# Altium schematic symbol library jlcpcb_2025_04_resistors_extended_2512.schlib: 2667 symbols (part 13 of 14)
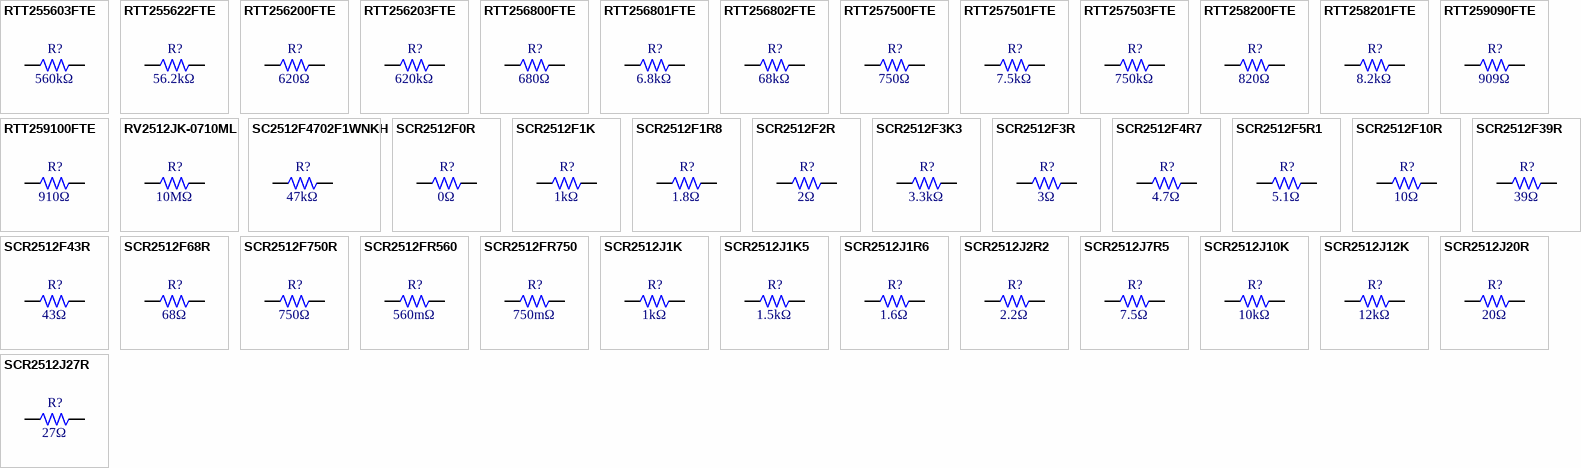
[diagram p78: symbols RTT255603FTE to SCR2512J27R]

## RTT256801FTE
designator R?  Resistance: 6.8kΩ  (hidden comment: *)
Resistor, 6.8kΩ, ±1%, 1W, 200V, ±100ppm/℃, -55℃~+155℃, SMD 2512; Manufacturer: Uniroyal; Manufacturer Part Number: RTT256801FTE; Supplier 1: LCSC; Supplier Part Number 1: C333662; JLCPCB Part Number: C333662; Power Rating: 1W; Category: Resistors; Package Size: 2512; JLCPCB Basic Part: Yes; Tolerance: ±1%; Voltage Rating: 200V; Temperature Coefficient: ±100ppm/℃; Temperature Rating: -55℃~+155℃; ComponentLink1Description: Datasheet; ComponentLink1URL: https://wmsc.lcsc.com/wmsc/upload/file/pdf/v2/lcsc/2304140030_RALEC-RTT256801FTE_C333662.pdf; ComponentLink2Description: JLCPCB Part URL; ComponentLink2URL: https://jlcpcb.com/partdetail/C333662
pins: 1, 2
1 alternate drawing of the same symbol

## RTT256802FTE
designator R?  Resistance: 68kΩ  (hidden comment: *)
Resistor, 68kΩ, ±1%, 1W, ±100ppm/℃, SMD 2512; Manufacturer: Uniroyal; Manufacturer Part Number: RTT256802FTE; Supplier 1: LCSC; Supplier Part Number 1: C881750; JLCPCB Part Number: C881750; Power Rating: 1W; Category: Resistors; Package Size: 2512; JLCPCB Basic Part: Yes; Tolerance: ±1%; Temperature Coefficient: ±100ppm/℃; ComponentLink1Description: Datasheet; ComponentLink1URL: https://wmsc.lcsc.com/wmsc/upload/file/pdf/v2/lcsc/2304140030_RALEC-RTT256802FTE_C881750.pdf; ComponentLink2Description: JLCPCB Part URL; ComponentLink2URL: https://jlcpcb.com/partdetail/C881750
pins: 1, 2
1 alternate drawing of the same symbol

## RTT257500FTE
designator R?  Resistance: 750Ω  (hidden comment: *)
Resistor, 750Ω, ±1%, 1W, 200V, ±100ppm/℃, -55℃~+155℃, SMD 2512; Manufacturer: Uniroyal; Manufacturer Part Number: RTT257500FTE; Supplier 1: LCSC; Supplier Part Number 1: C333671; JLCPCB Part Number: C333671; Power Rating: 1W; Category: Resistors; Package Size: 2512; JLCPCB Basic Part: Yes; Tolerance: ±1%; Voltage Rating: 200V; Temperature Coefficient: ±100ppm/℃; Temperature Rating: -55℃~+155℃; ComponentLink1Description: Datasheet; ComponentLink1URL: https://wmsc.lcsc.com/wmsc/upload/file/pdf/v2/lcsc/2304140030_RALEC-RTT257500FTE_C333671.pdf; ComponentLink2Description: JLCPCB Part URL; ComponentLink2URL: https://jlcpcb.com/partdetail/C333671
pins: 1, 2
1 alternate drawing of the same symbol

## RTT257501FTE
designator R?  Resistance: 7.5kΩ  (hidden comment: *)
Resistor, 7.5kΩ, ±1%, 1W, 200V, ±100ppm/℃, -55℃~+155℃, SMD 2512; Manufacturer: Uniroyal; Manufacturer Part Number: RTT257501FTE; Supplier 1: LCSC; Supplier Part Number 1: C333672; JLCPCB Part Number: C333672; Power Rating: 1W; Category: Resistors; Package Size: 2512; JLCPCB Basic Part: Yes; Tolerance: ±1%; Voltage Rating: 200V; Temperature Coefficient: ±100ppm/℃; Temperature Rating: -55℃~+155℃; ComponentLink1Description: Datasheet; ComponentLink1URL: https://wmsc.lcsc.com/wmsc/upload/file/pdf/v2/lcsc/2304140030_RALEC-RTT257501FTE_C333672.pdf; ComponentLink2Description: JLCPCB Part URL; ComponentLink2URL: https://jlcpcb.com/partdetail/C333672
pins: 1, 2
1 alternate drawing of the same symbol

## RTT257503FTE
designator R?  Resistance: 750kΩ  (hidden comment: *)
Resistor, 750kΩ, ±1%, 1W, 200V, ±100ppm/℃, -55℃~+155℃, SMD 2512; Manufacturer: Uniroyal; Manufacturer Part Number: RTT257503FTE; Supplier 1: LCSC; Supplier Part Number 1: C458524; JLCPCB Part Number: C458524; Power Rating: 1W; Category: Resistors; Package Size: 2512; JLCPCB Basic Part: Yes; Tolerance: ±1%; Voltage Rating: 200V; Temperature Coefficient: ±100ppm/℃; Temperature Rating: -55℃~+155℃; ComponentLink1Description: Datasheet; ComponentLink1URL: https://wmsc.lcsc.com/wmsc/upload/file/pdf/v2/lcsc/2304140030_RALEC-RTT257503FTE_C458524.pdf; ComponentLink2Description: JLCPCB Part URL; ComponentLink2URL: https://jlcpcb.com/partdetail/C458524
pins: 1, 2
1 alternate drawing of the same symbol

## RTT258200FTE
designator R?  Resistance: 820Ω  (hidden comment: *)
Resistor, 820Ω, ±1%, 1W, 200V, ±100ppm/℃, -55℃~+155℃, SMD 2512; Manufacturer: Uniroyal; Manufacturer Part Number: RTT258200FTE; Supplier 1: LCSC; Supplier Part Number 1: C333677; JLCPCB Part Number: C333677; Power Rating: 1W; Category: Resistors; Package Size: 2512; JLCPCB Basic Part: Yes; Tolerance: ±1%; Voltage Rating: 200V; Temperature Coefficient: ±100ppm/℃; Temperature Rating: -55℃~+155℃; ComponentLink1Description: Datasheet; ComponentLink1URL: https://wmsc.lcsc.com/wmsc/upload/file/pdf/v2/lcsc/2304140030_RALEC-RTT258200FTE_C333677.pdf; ComponentLink2Description: JLCPCB Part URL; ComponentLink2URL: https://jlcpcb.com/partdetail/C333677
pins: 1, 2
1 alternate drawing of the same symbol

## RTT258201FTE
designator R?  Resistance: 8.2kΩ  (hidden comment: *)
Resistor, 8.2kΩ, ±1%, 1W, 200V, ±100ppm/℃, -55℃~+155℃, SMD 2512; Manufacturer: Uniroyal; Manufacturer Part Number: RTT258201FTE; Supplier 1: LCSC; Supplier Part Number 1: C333678; JLCPCB Part Number: C333678; Power Rating: 1W; Category: Resistors; Package Size: 2512; JLCPCB Basic Part: Yes; Tolerance: ±1%; Voltage Rating: 200V; Temperature Coefficient: ±100ppm/℃; Temperature Rating: -55℃~+155℃; ComponentLink1Description: Datasheet; ComponentLink1URL: https://wmsc.lcsc.com/wmsc/upload/file/pdf/v2/lcsc/2304140030_RALEC-RTT258201FTE_C333678.pdf; ComponentLink2Description: JLCPCB Part URL; ComponentLink2URL: https://jlcpcb.com/partdetail/C333678
pins: 1, 2
1 alternate drawing of the same symbol

## RTT259090FTE
designator R?  Resistance: 909Ω  (hidden comment: *)
Resistor, 909Ω, ±1%, 1W, 200V, ±100ppm/℃, -55℃~+155℃, SMD 2512; Manufacturer: Uniroyal; Manufacturer Part Number: RTT259090FTE; Supplier 1: LCSC; Supplier Part Number 1: C333686; JLCPCB Part Number: C333686; Power Rating: 1W; Category: Resistors; Package Size: 2512; JLCPCB Basic Part: Yes; Tolerance: ±1%; Voltage Rating: 200V; Temperature Coefficient: ±100ppm/℃; Temperature Rating: -55℃~+155℃; ComponentLink1Description: Datasheet; ComponentLink1URL: https://wmsc.lcsc.com/wmsc/upload/file/pdf/v2/lcsc/2304140030_RALEC-RTT259090FTE_C333686.pdf; ComponentLink2Description: JLCPCB Part URL; ComponentLink2URL: https://jlcpcb.com/partdetail/C333686
pins: 1, 2
1 alternate drawing of the same symbol

## RTT259100FTE
designator R?  Resistance: 910Ω  (hidden comment: *)
Resistor, 910Ω, ±1%, 1W, 200V, ±100ppm/℃, -55℃~+155℃, SMD 2512; Manufacturer: Uniroyal; Manufacturer Part Number: RTT259100FTE; Supplier 1: LCSC; Supplier Part Number 1: C458648; JLCPCB Part Number: C458648; Power Rating: 1W; Category: Resistors; Package Size: 2512; JLCPCB Basic Part: Yes; Tolerance: ±1%; Voltage Rating: 200V; Temperature Coefficient: ±100ppm/℃; Temperature Rating: -55℃~+155℃; ComponentLink1Description: Datasheet; ComponentLink1URL: https://wmsc.lcsc.com/wmsc/upload/file/pdf/v2/lcsc/2304140030_RALEC-RTT259100FTE_C458648.pdf; ComponentLink2Description: JLCPCB Part URL; ComponentLink2URL: https://jlcpcb.com/partdetail/C458648
pins: 1, 2
1 alternate drawing of the same symbol

## RV2512JK-0710ML
designator R?  Resistance: 10MΩ  (hidden comment: *)
Resistor, 10MΩ, ±5%, 1W, ±200ppm/℃, -55℃~+155℃, SMD 2512; Manufacturer: Uniroyal; Manufacturer Part Number: RV2512JK-0710ML; Supplier 1: LCSC; Supplier Part Number 1: C326585; JLCPCB Part Number: C326585; Power Rating: 1W; Category: Resistors; Package Size: 2512; JLCPCB Basic Part: Yes; Tolerance: ±5%; Temperature Coefficient: ±200ppm/℃; Temperature Rating: -55℃~+155℃; ComponentLink1Description: Datasheet; ComponentLink1URL: https://wmsc.lcsc.com/wmsc/upload/file/pdf/v2/lcsc/2311211102_YAGEO-RV2512JK-0710ML_C326585.pdf; ComponentLink2Description: JLCPCB Part URL; ComponentLink2URL: https://jlcpcb.com/partdetail/C326585
pins: 1, 2
1 alternate drawing of the same symbol

## SC2512F4702F1WNKH
designator R?  Resistance: 47kΩ  (hidden comment: *)
Resistor, 47kΩ, ±1%, 1W, ±100ppm/℃, SMD 2512; Manufacturer: Uniroyal; Manufacturer Part Number: SC2512F4702F1WNKH; Supplier 1: LCSC; Supplier Part Number 1: C5140765; JLCPCB Part Number: C5140765; Power Rating: 1W; Category: Resistors; Package Size: 2512; JLCPCB Basic Part: Yes; Tolerance: ±1%; Temperature Coefficient: ±100ppm/℃; ComponentLink1Description: Datasheet; ComponentLink1URL: https://datasheet.lcsc.com/lcsc/2208161601_Sunway-SC2512F4702F1WNKH_C5140765.pdf; ComponentLink2Description: JLCPCB Part URL; ComponentLink2URL: https://jlcpcb.com/partdetail/C5140765
pins: 1, 2
1 alternate drawing of the same symbol

## SCR2512F0R
designator R?  Resistance: 0Ω  (hidden comment: *)
Resistor, 0Ω, ±1%, 1W, 200V, -55℃~+155℃, SMD 2512; Manufacturer: Uniroyal; Manufacturer Part Number: SCR2512F0R; Supplier 1: LCSC; Supplier Part Number 1: C3017432; JLCPCB Part Number: C3017432; Power Rating: 1W; Category: Resistors; Package Size: 2512; JLCPCB Basic Part: Yes; Tolerance: ±1%; Voltage Rating: 200V; Temperature Rating: -55℃~+155℃; ComponentLink1Description: Datasheet; ComponentLink1URL: https://wmsc.lcsc.com/wmsc/upload/file/pdf/v2/lcsc/2206021145_VO-SCR2512F0R_C3017432.pdf; ComponentLink2Description: JLCPCB Part URL; ComponentLink2URL: https://jlcpcb.com/partdetail/C3017432
pins: 1, 2
1 alternate drawing of the same symbol

## SCR2512F1K
designator R?  Resistance: 1kΩ  (hidden comment: *)
Resistor, 1kΩ, ±1%, 1W, 200V, -55℃~+155℃, SMD 2512; Manufacturer: Uniroyal; Manufacturer Part Number: SCR2512F1K; Supplier 1: LCSC; Supplier Part Number 1: C3017416; JLCPCB Part Number: C3017416; Power Rating: 1W; Category: Resistors; Package Size: 2512; JLCPCB Basic Part: Yes; Tolerance: ±1%; Voltage Rating: 200V; Temperature Rating: -55℃~+155℃; ComponentLink1Description: Datasheet; ComponentLink1URL: https://wmsc.lcsc.com/wmsc/upload/file/pdf/v2/lcsc/2206021145_VO-SCR2512F1K_C3017416.pdf; ComponentLink2Description: JLCPCB Part URL; ComponentLink2URL: https://jlcpcb.com/partdetail/C3017416
pins: 1, 2
1 alternate drawing of the same symbol

## SCR2512F1R8
designator R?  Resistance: 1.8Ω  (hidden comment: *)
Resistor, 1.8Ω, ±1%, 1W, 200V, -55℃~+155℃, SMD 2512; Manufacturer: Uniroyal; Manufacturer Part Number: SCR2512F1R8; Supplier 1: LCSC; Supplier Part Number 1: C3017421; JLCPCB Part Number: C3017421; Power Rating: 1W; Category: Resistors; Package Size: 2512; JLCPCB Basic Part: Yes; Tolerance: ±1%; Voltage Rating: 200V; Temperature Rating: -55℃~+155℃; ComponentLink1Description: Datasheet; ComponentLink1URL: https://wmsc.lcsc.com/wmsc/upload/file/pdf/v2/lcsc/2206021145_VO-SCR2512F1R8_C3017421.pdf; ComponentLink2Description: JLCPCB Part URL; ComponentLink2URL: https://jlcpcb.com/partdetail/C3017421
pins: 1, 2
1 alternate drawing of the same symbol

## SCR2512F2R
designator R?  Resistance: 2Ω  (hidden comment: *)
Resistor, 2Ω, ±1%, 1W, 200V, -55℃~+155℃, SMD 2512; Manufacturer: Uniroyal; Manufacturer Part Number: SCR2512F2R; Supplier 1: LCSC; Supplier Part Number 1: C3017428; JLCPCB Part Number: C3017428; Power Rating: 1W; Category: Resistors; Package Size: 2512; JLCPCB Basic Part: Yes; Tolerance: ±1%; Voltage Rating: 200V; Temperature Rating: -55℃~+155℃; ComponentLink1Description: Datasheet; ComponentLink1URL: https://wmsc.lcsc.com/wmsc/upload/file/pdf/v2/lcsc/2206021145_VO-SCR2512F2R_C3017428.pdf; ComponentLink2Description: JLCPCB Part URL; ComponentLink2URL: https://jlcpcb.com/partdetail/C3017428
pins: 1, 2
1 alternate drawing of the same symbol

## SCR2512F3K3
designator R?  Resistance: 3.3kΩ  (hidden comment: *)
Resistor, 3.3kΩ, ±1%, 1W, 200V, -55℃~+155℃, SMD 2512; Manufacturer: Uniroyal; Manufacturer Part Number: SCR2512F3K3; Supplier 1: LCSC; Supplier Part Number 1: C3017422; JLCPCB Part Number: C3017422; Power Rating: 1W; Category: Resistors; Package Size: 2512; JLCPCB Basic Part: Yes; Tolerance: ±1%; Voltage Rating: 200V; Temperature Rating: -55℃~+155℃; ComponentLink1Description: Datasheet; ComponentLink1URL: https://wmsc.lcsc.com/wmsc/upload/file/pdf/v2/lcsc/2206021145_VO-SCR2512F3K3_C3017422.pdf; ComponentLink2Description: JLCPCB Part URL; ComponentLink2URL: https://jlcpcb.com/partdetail/C3017422
pins: 1, 2
1 alternate drawing of the same symbol

## SCR2512F3R
designator R?  Resistance: 3Ω  (hidden comment: *)
Resistor, 3Ω, ±1%, 1W, 200V, -55℃~+155℃, SMD 2512; Manufacturer: Uniroyal; Manufacturer Part Number: SCR2512F3R; Supplier 1: LCSC; Supplier Part Number 1: C3017437; JLCPCB Part Number: C3017437; Power Rating: 1W; Category: Resistors; Package Size: 2512; JLCPCB Basic Part: Yes; Tolerance: ±1%; Voltage Rating: 200V; Temperature Rating: -55℃~+155℃; ComponentLink1Description: Datasheet; ComponentLink1URL: https://wmsc.lcsc.com/wmsc/upload/file/pdf/v2/lcsc/2206021145_VO-SCR2512F3R_C3017437.pdf; ComponentLink2Description: JLCPCB Part URL; ComponentLink2URL: https://jlcpcb.com/partdetail/C3017437
pins: 1, 2
1 alternate drawing of the same symbol

## SCR2512F4R7
designator R?  Resistance: 4.7Ω  (hidden comment: *)
Resistor, 4.7Ω, ±1%, 1W, 200V, -55℃~+155℃, SMD 2512; Manufacturer: Uniroyal; Manufacturer Part Number: SCR2512F4R7; Supplier 1: LCSC; Supplier Part Number 1: C3017415; JLCPCB Part Number: C3017415; Power Rating: 1W; Category: Resistors; Package Size: 2512; JLCPCB Basic Part: Yes; Tolerance: ±1%; Voltage Rating: 200V; Temperature Rating: -55℃~+155℃; ComponentLink1Description: Datasheet; ComponentLink1URL: https://wmsc.lcsc.com/wmsc/upload/file/pdf/v2/lcsc/2206021145_VO-SCR2512F4R7_C3017415.pdf; ComponentLink2Description: JLCPCB Part URL; ComponentLink2URL: https://jlcpcb.com/partdetail/C3017415
pins: 1, 2
1 alternate drawing of the same symbol

## SCR2512F5R1
designator R?  Resistance: 5.1Ω  (hidden comment: *)
Resistor, 5.1Ω, ±1%, 1W, 200V, -55℃~+155℃, SMD 2512; Manufacturer: Uniroyal; Manufacturer Part Number: SCR2512F5R1; Supplier 1: LCSC; Supplier Part Number 1: C3017427; JLCPCB Part Number: C3017427; Power Rating: 1W; Category: Resistors; Package Size: 2512; JLCPCB Basic Part: Yes; Tolerance: ±1%; Voltage Rating: 200V; Temperature Rating: -55℃~+155℃; ComponentLink1Description: Datasheet; ComponentLink1URL: https://wmsc.lcsc.com/wmsc/upload/file/pdf/v2/lcsc/2206021145_VO-SCR2512F5R1_C3017427.pdf; ComponentLink2Description: JLCPCB Part URL; ComponentLink2URL: https://jlcpcb.com/partdetail/C3017427
pins: 1, 2
1 alternate drawing of the same symbol

## SCR2512F10R
designator R?  Resistance: 10Ω  (hidden comment: *)
Resistor, 10Ω, ±1%, 1W, 200V, -55℃~+155℃, SMD 2512; Manufacturer: Uniroyal; Manufacturer Part Number: SCR2512F10R; Supplier 1: LCSC; Supplier Part Number 1: C3017441; JLCPCB Part Number: C3017441; Power Rating: 1W; Category: Resistors; Package Size: 2512; JLCPCB Basic Part: Yes; Tolerance: ±1%; Voltage Rating: 200V; Temperature Rating: -55℃~+155℃; ComponentLink1Description: Datasheet; ComponentLink1URL: https://wmsc.lcsc.com/wmsc/upload/file/pdf/v2/lcsc/2206021145_VO-SCR2512F10R_C3017441.pdf; ComponentLink2Description: JLCPCB Part URL; ComponentLink2URL: https://jlcpcb.com/partdetail/C3017441
pins: 1, 2
1 alternate drawing of the same symbol

## SCR2512F39R
designator R?  Resistance: 39Ω  (hidden comment: *)
Resistor, 39Ω, ±1%, 1W, 200V, -55℃~+155℃, SMD 2512; Manufacturer: Uniroyal; Manufacturer Part Number: SCR2512F39R; Supplier 1: LCSC; Supplier Part Number 1: C3017431; JLCPCB Part Number: C3017431; Power Rating: 1W; Category: Resistors; Package Size: 2512; JLCPCB Basic Part: Yes; Tolerance: ±1%; Voltage Rating: 200V; Temperature Rating: -55℃~+155℃; ComponentLink1Description: Datasheet; ComponentLink1URL: https://wmsc.lcsc.com/wmsc/upload/file/pdf/v2/lcsc/2206021145_VO-SCR2512F39R_C3017431.pdf; ComponentLink2Description: JLCPCB Part URL; ComponentLink2URL: https://jlcpcb.com/partdetail/C3017431
pins: 1, 2
1 alternate drawing of the same symbol

## SCR2512F43R
designator R?  Resistance: 43Ω  (hidden comment: *)
Resistor, 43Ω, ±1%, 1W, 200V, -55℃~+155℃, SMD 2512; Manufacturer: Uniroyal; Manufacturer Part Number: SCR2512F43R; Supplier 1: LCSC; Supplier Part Number 1: C3017446; JLCPCB Part Number: C3017446; Power Rating: 1W; Category: Resistors; Package Size: 2512; JLCPCB Basic Part: Yes; Tolerance: ±1%; Voltage Rating: 200V; Temperature Rating: -55℃~+155℃; ComponentLink1Description: Datasheet; ComponentLink1URL: https://wmsc.lcsc.com/wmsc/upload/file/pdf/v2/lcsc/2206021145_VO-SCR2512F43R_C3017446.pdf; ComponentLink2Description: JLCPCB Part URL; ComponentLink2URL: https://jlcpcb.com/partdetail/C3017446
pins: 1, 2
1 alternate drawing of the same symbol

## SCR2512F68R
designator R?  Resistance: 68Ω  (hidden comment: *)
Resistor, 68Ω, ±1%, 1W, 200V, -55℃~+155℃, SMD 2512; Manufacturer: Uniroyal; Manufacturer Part Number: SCR2512F68R; Supplier 1: LCSC; Supplier Part Number 1: C3017448; JLCPCB Part Number: C3017448; Power Rating: 1W; Category: Resistors; Package Size: 2512; JLCPCB Basic Part: Yes; Tolerance: ±1%; Voltage Rating: 200V; Temperature Rating: -55℃~+155℃; ComponentLink1Description: Datasheet; ComponentLink1URL: https://wmsc.lcsc.com/wmsc/upload/file/pdf/v2/lcsc/2206021145_VO-SCR2512F68R_C3017448.pdf; ComponentLink2Description: JLCPCB Part URL; ComponentLink2URL: https://jlcpcb.com/partdetail/C3017448
pins: 1, 2
1 alternate drawing of the same symbol

## SCR2512F750R
designator R?  Resistance: 750Ω  (hidden comment: *)
Resistor, 750Ω, ±1%, 1W, 200V, -55℃~+155℃, SMD 2512; Manufacturer: Uniroyal; Manufacturer Part Number: SCR2512F750R; Supplier 1: LCSC; Supplier Part Number 1: C3017434; JLCPCB Part Number: C3017434; Power Rating: 1W; Category: Resistors; Package Size: 2512; JLCPCB Basic Part: Yes; Tolerance: ±1%; Voltage Rating: 200V; Temperature Rating: -55℃~+155℃; ComponentLink1Description: Datasheet; ComponentLink1URL: https://wmsc.lcsc.com/wmsc/upload/file/pdf/v2/lcsc/2206021145_VO-SCR2512F750R_C3017434.pdf; ComponentLink2Description: JLCPCB Part URL; ComponentLink2URL: https://jlcpcb.com/partdetail/C3017434
pins: 1, 2
1 alternate drawing of the same symbol

## SCR2512FR560
designator R?  Resistance: 560mΩ  (hidden comment: *)
Resistor, 560mΩ, ±1%, 1W, 200V, -55℃~+155℃, SMD 2512; Manufacturer: Uniroyal; Manufacturer Part Number: SCR2512FR560; Supplier 1: LCSC; Supplier Part Number 1: C3017414; JLCPCB Part Number: C3017414; Power Rating: 1W; Category: Resistors; Package Size: 2512; JLCPCB Basic Part: Yes; Tolerance: ±1%; Voltage Rating: 200V; Temperature Rating: -55℃~+155℃; ComponentLink1Description: Datasheet; ComponentLink1URL: https://wmsc.lcsc.com/wmsc/upload/file/pdf/v2/lcsc/2206021145_VO-SCR2512FR560_C3017414.pdf; ComponentLink2Description: JLCPCB Part URL; ComponentLink2URL: https://jlcpcb.com/partdetail/C3017414
pins: 1, 2
1 alternate drawing of the same symbol

## SCR2512FR750
designator R?  Resistance: 750mΩ  (hidden comment: *)
Resistor, 750mΩ, ±1%, 1W, 200V, -55℃~+155℃, SMD 2512; Manufacturer: Uniroyal; Manufacturer Part Number: SCR2512FR750; Supplier 1: LCSC; Supplier Part Number 1: C3017426; JLCPCB Part Number: C3017426; Power Rating: 1W; Category: Resistors; Package Size: 2512; JLCPCB Basic Part: Yes; Tolerance: ±1%; Voltage Rating: 200V; Temperature Rating: -55℃~+155℃; ComponentLink1Description: Datasheet; ComponentLink1URL: https://wmsc.lcsc.com/wmsc/upload/file/pdf/v2/lcsc/2206021145_VO-SCR2512FR750_C3017426.pdf; ComponentLink2Description: JLCPCB Part URL; ComponentLink2URL: https://jlcpcb.com/partdetail/C3017426
pins: 1, 2
1 alternate drawing of the same symbol

## SCR2512J1K
designator R?  Resistance: 1kΩ  (hidden comment: *)
Resistor, 1kΩ, ±5%, SMD 2512; Manufacturer: Uniroyal; Manufacturer Part Number: SCR2512J1K; Supplier 1: LCSC; Supplier Part Number 1: C3018451; JLCPCB Part Number: C3018451; Category: Resistors; Package Size: 2512; JLCPCB Basic Part: Yes; Tolerance: ±5%; ComponentLink1Description: Datasheet; ComponentLink1URL: https://wmsc.lcsc.com/wmsc/upload/file/pdf/v2/lcsc/2205131745_VO-SCR2512J1K_C3018451.pdf; ComponentLink2Description: JLCPCB Part URL; ComponentLink2URL: https://jlcpcb.com/partdetail/C3018451
pins: 1, 2
1 alternate drawing of the same symbol

## SCR2512J1K5
designator R?  Resistance: 1.5kΩ  (hidden comment: *)
Resistor, 1.5kΩ, ±5%, 1W, 200V, -55℃~+155℃, SMD 2512; Manufacturer: Uniroyal; Manufacturer Part Number: SCR2512J1K5; Supplier 1: LCSC; Supplier Part Number 1: C3018404; JLCPCB Part Number: C3018404; Power Rating: 1W; Category: Resistors; Package Size: 2512; JLCPCB Basic Part: Yes; Tolerance: ±5%; Voltage Rating: 200V; Temperature Rating: -55℃~+155℃; ComponentLink1Description: Datasheet; ComponentLink1URL: https://wmsc.lcsc.com/wmsc/upload/file/pdf/v2/lcsc/2205131745_VO-SCR2512J1K5_C3018404.pdf; ComponentLink2Description: JLCPCB Part URL; ComponentLink2URL: https://jlcpcb.com/partdetail/C3018404
pins: 1, 2
1 alternate drawing of the same symbol

## SCR2512J1R6
designator R?  Resistance: 1.6Ω  (hidden comment: *)
Resistor, 1.6Ω, ±5%, 1W, 200V, -55℃~+155℃, SMD 2512; Manufacturer: Uniroyal; Manufacturer Part Number: SCR2512J1R6; Supplier 1: LCSC; Supplier Part Number 1: C3018430; JLCPCB Part Number: C3018430; Power Rating: 1W; Category: Resistors; Package Size: 2512; JLCPCB Basic Part: Yes; Tolerance: ±5%; Voltage Rating: 200V; Temperature Rating: -55℃~+155℃; ComponentLink1Description: Datasheet; ComponentLink1URL: https://wmsc.lcsc.com/wmsc/upload/file/pdf/v2/lcsc/2205131745_VO-SCR2512J1R6_C3018430.pdf; ComponentLink2Description: JLCPCB Part URL; ComponentLink2URL: https://jlcpcb.com/partdetail/C3018430
pins: 1, 2
1 alternate drawing of the same symbol

## SCR2512J2R2
designator R?  Resistance: 2.2Ω  (hidden comment: *)
Resistor, 2.2Ω, ±5%, 1W, 200V, -55℃~+155℃, SMD 2512; Manufacturer: Uniroyal; Manufacturer Part Number: SCR2512J2R2; Supplier 1: LCSC; Supplier Part Number 1: C3018356; JLCPCB Part Number: C3018356; Power Rating: 1W; Category: Resistors; Package Size: 2512; JLCPCB Basic Part: Yes; Tolerance: ±5%; Voltage Rating: 200V; Temperature Rating: -55℃~+155℃; ComponentLink1Description: Datasheet; ComponentLink1URL: https://wmsc.lcsc.com/wmsc/upload/file/pdf/v2/lcsc/2205131745_VO-SCR2512J2R2_C3018356.pdf; ComponentLink2Description: JLCPCB Part URL; ComponentLink2URL: https://jlcpcb.com/partdetail/C3018356
pins: 1, 2
1 alternate drawing of the same symbol

## SCR2512J7R5
designator R?  Resistance: 7.5Ω  (hidden comment: *)
Resistor, 7.5Ω, ±5%, 1W, 200V, -55℃~+155℃, SMD 2512; Manufacturer: Uniroyal; Manufacturer Part Number: SCR2512J7R5; Supplier 1: LCSC; Supplier Part Number 1: C3018444; JLCPCB Part Number: C3018444; Power Rating: 1W; Category: Resistors; Package Size: 2512; JLCPCB Basic Part: Yes; Tolerance: ±5%; Voltage Rating: 200V; Temperature Rating: -55℃~+155℃; ComponentLink1Description: Datasheet; ComponentLink1URL: https://wmsc.lcsc.com/wmsc/upload/file/pdf/v2/lcsc/2205131745_VO-SCR2512J7R5_C3018444.pdf; ComponentLink2Description: JLCPCB Part URL; ComponentLink2URL: https://jlcpcb.com/partdetail/C3018444
pins: 1, 2
1 alternate drawing of the same symbol

## SCR2512J10K
designator R?  Resistance: 10kΩ  (hidden comment: *)
Resistor, 10kΩ, ±5%, SMD 2512; Manufacturer: Uniroyal; Manufacturer Part Number: SCR2512J10K; Supplier 1: LCSC; Supplier Part Number 1: C3018394; JLCPCB Part Number: C3018394; Category: Resistors; Package Size: 2512; JLCPCB Basic Part: Yes; Tolerance: ±5%; ComponentLink1Description: Datasheet; ComponentLink1URL: https://wmsc.lcsc.com/wmsc/upload/file/pdf/v2/lcsc/2205131745_VO-SCR2512J10K_C3018394.pdf; ComponentLink2Description: JLCPCB Part URL; ComponentLink2URL: https://jlcpcb.com/partdetail/C3018394
pins: 1, 2
1 alternate drawing of the same symbol

## SCR2512J12K
designator R?  Resistance: 12kΩ  (hidden comment: *)
Resistor, 12kΩ, ±5%, 1W, 200V, -55℃~+155℃, SMD 2512; Manufacturer: Uniroyal; Manufacturer Part Number: SCR2512J12K; Supplier 1: LCSC; Supplier Part Number 1: C3018359; JLCPCB Part Number: C3018359; Power Rating: 1W; Category: Resistors; Package Size: 2512; JLCPCB Basic Part: Yes; Tolerance: ±5%; Voltage Rating: 200V; Temperature Rating: -55℃~+155℃; ComponentLink1Description: Datasheet; ComponentLink1URL: https://wmsc.lcsc.com/wmsc/upload/file/pdf/v2/lcsc/2205131745_VO-SCR2512J12K_C3018359.pdf; ComponentLink2Description: JLCPCB Part URL; ComponentLink2URL: https://jlcpcb.com/partdetail/C3018359
pins: 1, 2
1 alternate drawing of the same symbol

## SCR2512J20R
designator R?  Resistance: 20Ω  (hidden comment: *)
Resistor, 20Ω, ±5%, 1W, 200V, -55℃~+155℃, SMD 2512; Manufacturer: Uniroyal; Manufacturer Part Number: SCR2512J20R; Supplier 1: LCSC; Supplier Part Number 1: C3018419; JLCPCB Part Number: C3018419; Power Rating: 1W; Category: Resistors; Package Size: 2512; JLCPCB Basic Part: Yes; Tolerance: ±5%; Voltage Rating: 200V; Temperature Rating: -55℃~+155℃; ComponentLink1Description: Datasheet; ComponentLink1URL: https://wmsc.lcsc.com/wmsc/upload/file/pdf/v2/lcsc/2205131745_VO-SCR2512J20R_C3018419.pdf; ComponentLink2Description: JLCPCB Part URL; ComponentLink2URL: https://jlcpcb.com/partdetail/C3018419
pins: 1, 2
1 alternate drawing of the same symbol

## SCR2512J27R
designator R?  Resistance: 27Ω  (hidden comment: *)
Resistor, 27Ω, ±5%, 1W, 200V, -55℃~+155℃, SMD 2512; Manufacturer: Uniroyal; Manufacturer Part Number: SCR2512J27R; Supplier 1: LCSC; Supplier Part Number 1: C3018415; JLCPCB Part Number: C3018415; Power Rating: 1W; Category: Resistors; Package Size: 2512; JLCPCB Basic Part: Yes; Tolerance: ±5%; Voltage Rating: 200V; Temperature Rating: -55℃~+155℃; ComponentLink1Description: Datasheet; ComponentLink1URL: https://wmsc.lcsc.com/wmsc/upload/file/pdf/v2/lcsc/2205131745_VO-SCR2512J27R_C3018415.pdf; ComponentLink2Description: JLCPCB Part URL; ComponentLink2URL: https://jlcpcb.com/partdetail/C3018415
pins: 1, 2
1 alternate drawing of the same symbol

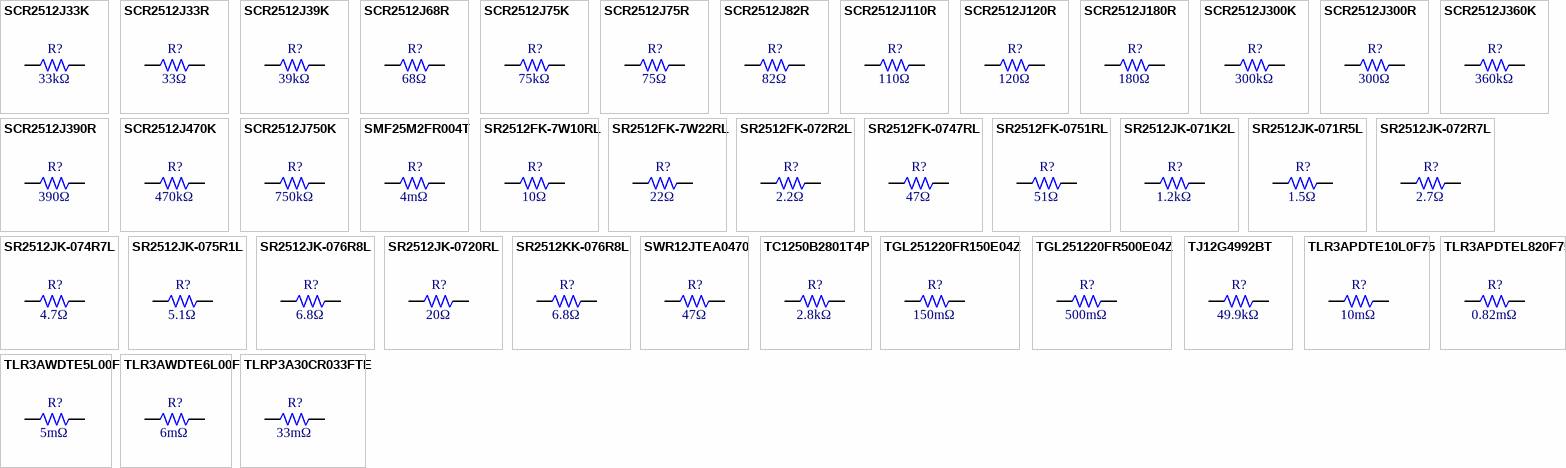
[diagram p61: symbols SCR2512J33K to TLRP3A30CR033FTE]

## SCR2512J33K
designator R?  Resistance: 33kΩ  (hidden comment: *)
Resistor, 33kΩ, ±5%, 1W, 200V, -55℃~+155℃, SMD 2512; Manufacturer: Uniroyal; Manufacturer Part Number: SCR2512J33K; Supplier 1: LCSC; Supplier Part Number 1: C3018397; JLCPCB Part Number: C3018397; Power Rating: 1W; Category: Resistors; Package Size: 2512; JLCPCB Basic Part: Yes; Tolerance: ±5%; Voltage Rating: 200V; Temperature Rating: -55℃~+155℃; ComponentLink1Description: Datasheet; ComponentLink1URL: https://wmsc.lcsc.com/wmsc/upload/file/pdf/v2/lcsc/2205131745_VO-SCR2512J33K_C3018397.pdf; ComponentLink2Description: JLCPCB Part URL; ComponentLink2URL: https://jlcpcb.com/partdetail/C3018397
pins: 1, 2
1 alternate drawing of the same symbol

## SCR2512J33R
designator R?  Resistance: 33Ω  (hidden comment: *)
Resistor, 33Ω, ±5%, 1W, 200V, -55℃~+155℃, SMD 2512; Manufacturer: Uniroyal; Manufacturer Part Number: SCR2512J33R; Supplier 1: LCSC; Supplier Part Number 1: C3018437; JLCPCB Part Number: C3018437; Power Rating: 1W; Category: Resistors; Package Size: 2512; JLCPCB Basic Part: Yes; Tolerance: ±5%; Voltage Rating: 200V; Temperature Rating: -55℃~+155℃; ComponentLink1Description: Datasheet; ComponentLink1URL: https://wmsc.lcsc.com/wmsc/upload/file/pdf/v2/lcsc/2205131745_VO-SCR2512J33R_C3018437.pdf; ComponentLink2Description: JLCPCB Part URL; ComponentLink2URL: https://jlcpcb.com/partdetail/C3018437
pins: 1, 2
1 alternate drawing of the same symbol

## SCR2512J39K
designator R?  Resistance: 39kΩ  (hidden comment: *)
Resistor, 39kΩ, ±5%, 1W, 200V, -55℃~+155℃, SMD 2512; Manufacturer: Uniroyal; Manufacturer Part Number: SCR2512J39K; Supplier 1: LCSC; Supplier Part Number 1: C3018431; JLCPCB Part Number: C3018431; Power Rating: 1W; Category: Resistors; Package Size: 2512; JLCPCB Basic Part: Yes; Tolerance: ±5%; Voltage Rating: 200V; Temperature Rating: -55℃~+155℃; ComponentLink1Description: Datasheet; ComponentLink1URL: https://wmsc.lcsc.com/wmsc/upload/file/pdf/v2/lcsc/2205131745_VO-SCR2512J39K_C3018431.pdf; ComponentLink2Description: JLCPCB Part URL; ComponentLink2URL: https://jlcpcb.com/partdetail/C3018431
pins: 1, 2
1 alternate drawing of the same symbol

## SCR2512J68R
designator R?  Resistance: 68Ω  (hidden comment: *)
Resistor, 68Ω, ±5%, 1W, 200V, -55℃~+155℃, SMD 2512; Manufacturer: Uniroyal; Manufacturer Part Number: SCR2512J68R; Supplier 1: LCSC; Supplier Part Number 1: C3018412; JLCPCB Part Number: C3018412; Power Rating: 1W; Category: Resistors; Package Size: 2512; JLCPCB Basic Part: Yes; Tolerance: ±5%; Voltage Rating: 200V; Temperature Rating: -55℃~+155℃; ComponentLink1Description: Datasheet; ComponentLink1URL: https://wmsc.lcsc.com/wmsc/upload/file/pdf/v2/lcsc/2205131745_VO-SCR2512J68R_C3018412.pdf; ComponentLink2Description: JLCPCB Part URL; ComponentLink2URL: https://jlcpcb.com/partdetail/C3018412
pins: 1, 2
1 alternate drawing of the same symbol

## SCR2512J75K
designator R?  Resistance: 75kΩ  (hidden comment: *)
Resistor, 75kΩ, ±5%, 1W, 200V, -55℃~+155℃, SMD 2512; Manufacturer: Uniroyal; Manufacturer Part Number: SCR2512J75K; Supplier 1: LCSC; Supplier Part Number 1: C3018367; JLCPCB Part Number: C3018367; Power Rating: 1W; Category: Resistors; Package Size: 2512; JLCPCB Basic Part: Yes; Tolerance: ±5%; Voltage Rating: 200V; Temperature Rating: -55℃~+155℃; ComponentLink1Description: Datasheet; ComponentLink1URL: https://wmsc.lcsc.com/wmsc/upload/file/pdf/v2/lcsc/2205131745_VO-SCR2512J75K_C3018367.pdf; ComponentLink2Description: JLCPCB Part URL; ComponentLink2URL: https://jlcpcb.com/partdetail/C3018367
pins: 1, 2
1 alternate drawing of the same symbol

## SCR2512J75R
designator R?  Resistance: 75Ω  (hidden comment: *)
Resistor, 75Ω, ±5%, 1W, 200V, -55℃~+155℃, SMD 2512; Manufacturer: Uniroyal; Manufacturer Part Number: SCR2512J75R; Supplier 1: LCSC; Supplier Part Number 1: C3018369; JLCPCB Part Number: C3018369; Power Rating: 1W; Category: Resistors; Package Size: 2512; JLCPCB Basic Part: Yes; Tolerance: ±5%; Voltage Rating: 200V; Temperature Rating: -55℃~+155℃; ComponentLink1Description: Datasheet; ComponentLink1URL: https://wmsc.lcsc.com/wmsc/upload/file/pdf/v2/lcsc/2205131745_VO-SCR2512J75R_C3018369.pdf; ComponentLink2Description: JLCPCB Part URL; ComponentLink2URL: https://jlcpcb.com/partdetail/C3018369
pins: 1, 2
1 alternate drawing of the same symbol

## SCR2512J82R
designator R?  Resistance: 82Ω  (hidden comment: *)
Resistor, 82Ω, ±5%, 1W, 200V, -55℃~+155℃, SMD 2512; Manufacturer: Uniroyal; Manufacturer Part Number: SCR2512J82R; Supplier 1: LCSC; Supplier Part Number 1: C3018435; JLCPCB Part Number: C3018435; Power Rating: 1W; Category: Resistors; Package Size: 2512; JLCPCB Basic Part: Yes; Tolerance: ±5%; Voltage Rating: 200V; Temperature Rating: -55℃~+155℃; ComponentLink1Description: Datasheet; ComponentLink1URL: https://wmsc.lcsc.com/wmsc/upload/file/pdf/v2/lcsc/2205131745_VO-SCR2512J82R_C3018435.pdf; ComponentLink2Description: JLCPCB Part URL; ComponentLink2URL: https://jlcpcb.com/partdetail/C3018435
pins: 1, 2
1 alternate drawing of the same symbol

## SCR2512J110R
designator R?  Resistance: 110Ω  (hidden comment: *)
Resistor, 110Ω, ±5%, 1W, 200V, -55℃~+155℃, SMD 2512; Manufacturer: Uniroyal; Manufacturer Part Number: SCR2512J110R; Supplier 1: LCSC; Supplier Part Number 1: C3018379; JLCPCB Part Number: C3018379; Power Rating: 1W; Category: Resistors; Package Size: 2512; JLCPCB Basic Part: Yes; Tolerance: ±5%; Voltage Rating: 200V; Temperature Rating: -55℃~+155℃; ComponentLink1Description: Datasheet; ComponentLink1URL: https://wmsc.lcsc.com/wmsc/upload/file/pdf/v2/lcsc/2205131745_VO-SCR2512J110R_C3018379.pdf; ComponentLink2Description: JLCPCB Part URL; ComponentLink2URL: https://jlcpcb.com/partdetail/C3018379
pins: 1, 2
1 alternate drawing of the same symbol

## SCR2512J120R
designator R?  Resistance: 120Ω  (hidden comment: *)
Resistor, 120Ω, ±5%, 1W, 200V, -55℃~+155℃, SMD 2512; Manufacturer: Uniroyal; Manufacturer Part Number: SCR2512J120R; Supplier 1: LCSC; Supplier Part Number 1: C3018454; JLCPCB Part Number: C3018454; Power Rating: 1W; Category: Resistors; Package Size: 2512; JLCPCB Basic Part: Yes; Tolerance: ±5%; Voltage Rating: 200V; Temperature Rating: -55℃~+155℃; ComponentLink1Description: Datasheet; ComponentLink1URL: https://wmsc.lcsc.com/wmsc/upload/file/pdf/v2/lcsc/2205131745_VO-SCR2512J120R_C3018454.pdf; ComponentLink2Description: JLCPCB Part URL; ComponentLink2URL: https://jlcpcb.com/partdetail/C3018454
pins: 1, 2
1 alternate drawing of the same symbol

## SCR2512J180R
designator R?  Resistance: 180Ω  (hidden comment: *)
Resistor, 180Ω, ±5%, 1W, 200V, -55℃~+155℃, SMD 2512; Manufacturer: Uniroyal; Manufacturer Part Number: SCR2512J180R; Supplier 1: LCSC; Supplier Part Number 1: C3018433; JLCPCB Part Number: C3018433; Power Rating: 1W; Category: Resistors; Package Size: 2512; JLCPCB Basic Part: Yes; Tolerance: ±5%; Voltage Rating: 200V; Temperature Rating: -55℃~+155℃; ComponentLink1Description: Datasheet; ComponentLink1URL: https://wmsc.lcsc.com/wmsc/upload/file/pdf/v2/lcsc/2205131745_VO-SCR2512J180R_C3018433.pdf; ComponentLink2Description: JLCPCB Part URL; ComponentLink2URL: https://jlcpcb.com/partdetail/C3018433
pins: 1, 2
1 alternate drawing of the same symbol

## SCR2512J300K
designator R?  Resistance: 300kΩ  (hidden comment: *)
Resistor, 300kΩ, ±5%, 1W, 200V, -55℃~+155℃, SMD 2512; Manufacturer: Uniroyal; Manufacturer Part Number: SCR2512J300K; Supplier 1: LCSC; Supplier Part Number 1: C3018370; JLCPCB Part Number: C3018370; Power Rating: 1W; Category: Resistors; Package Size: 2512; JLCPCB Basic Part: Yes; Tolerance: ±5%; Voltage Rating: 200V; Temperature Rating: -55℃~+155℃; ComponentLink1Description: Datasheet; ComponentLink1URL: https://wmsc.lcsc.com/wmsc/upload/file/pdf/v2/lcsc/2205131745_VO-SCR2512J300K_C3018370.pdf; ComponentLink2Description: JLCPCB Part URL; ComponentLink2URL: https://jlcpcb.com/partdetail/C3018370
pins: 1, 2
1 alternate drawing of the same symbol

## SCR2512J300R
designator R?  Resistance: 300Ω  (hidden comment: *)
Resistor, 300Ω, ±5%, 1W, 200V, -55℃~+155℃, SMD 2512; Manufacturer: Uniroyal; Manufacturer Part Number: SCR2512J300R; Supplier 1: LCSC; Supplier Part Number 1: C3018422; JLCPCB Part Number: C3018422; Power Rating: 1W; Category: Resistors; Package Size: 2512; JLCPCB Basic Part: Yes; Tolerance: ±5%; Voltage Rating: 200V; Temperature Rating: -55℃~+155℃; ComponentLink1Description: Datasheet; ComponentLink1URL: https://wmsc.lcsc.com/wmsc/upload/file/pdf/v2/lcsc/2205131745_VO-SCR2512J300R_C3018422.pdf; ComponentLink2Description: JLCPCB Part URL; ComponentLink2URL: https://jlcpcb.com/partdetail/C3018422
pins: 1, 2
1 alternate drawing of the same symbol

## SCR2512J360K
designator R?  Resistance: 360kΩ  (hidden comment: *)
Resistor, 360kΩ, ±5%, 1W, 200V, -55℃~+155℃, SMD 2512; Manufacturer: Uniroyal; Manufacturer Part Number: SCR2512J360K; Supplier 1: LCSC; Supplier Part Number 1: C3018445; JLCPCB Part Number: C3018445; Power Rating: 1W; Category: Resistors; Package Size: 2512; JLCPCB Basic Part: Yes; Tolerance: ±5%; Voltage Rating: 200V; Temperature Rating: -55℃~+155℃; ComponentLink1Description: Datasheet; ComponentLink1URL: https://wmsc.lcsc.com/wmsc/upload/file/pdf/v2/lcsc/2205131730_VO-SCR2512J360K_C3018445.pdf; ComponentLink2Description: JLCPCB Part URL; ComponentLink2URL: https://jlcpcb.com/partdetail/C3018445
pins: 1, 2
1 alternate drawing of the same symbol

## SCR2512J390R
designator R?  Resistance: 390Ω  (hidden comment: *)
Resistor, 390Ω, ±5%, 1W, 200V, -55℃~+155℃, SMD 2512; Manufacturer: Uniroyal; Manufacturer Part Number: SCR2512J390R; Supplier 1: LCSC; Supplier Part Number 1: C3018413; JLCPCB Part Number: C3018413; Power Rating: 1W; Category: Resistors; Package Size: 2512; JLCPCB Basic Part: Yes; Tolerance: ±5%; Voltage Rating: 200V; Temperature Rating: -55℃~+155℃; ComponentLink1Description: Datasheet; ComponentLink1URL: https://wmsc.lcsc.com/wmsc/upload/file/pdf/v2/lcsc/2205131745_VO-SCR2512J390R_C3018413.pdf; ComponentLink2Description: JLCPCB Part URL; ComponentLink2URL: https://jlcpcb.com/partdetail/C3018413
pins: 1, 2
1 alternate drawing of the same symbol

## SCR2512J470K
designator R?  Resistance: 470kΩ  (hidden comment: *)
Resistor, 470kΩ, ±5%, 1W, 200V, -55℃~+155℃, SMD 2512; Manufacturer: Uniroyal; Manufacturer Part Number: SCR2512J470K; Supplier 1: LCSC; Supplier Part Number 1: C3018392; JLCPCB Part Number: C3018392; Power Rating: 1W; Category: Resistors; Package Size: 2512; JLCPCB Basic Part: Yes; Tolerance: ±5%; Voltage Rating: 200V; Temperature Rating: -55℃~+155℃; ComponentLink1Description: Datasheet; ComponentLink1URL: https://wmsc.lcsc.com/wmsc/upload/file/pdf/v2/lcsc/2205131745_VO-SCR2512J470K_C3018392.pdf; ComponentLink2Description: JLCPCB Part URL; ComponentLink2URL: https://jlcpcb.com/partdetail/C3018392
pins: 1, 2
1 alternate drawing of the same symbol

## SCR2512J750K
designator R?  Resistance: 750kΩ  (hidden comment: *)
Resistor, 750kΩ, ±5%, 1W, 200V, -55℃~+155℃, SMD 2512; Manufacturer: Uniroyal; Manufacturer Part Number: SCR2512J750K; Supplier 1: LCSC; Supplier Part Number 1: C3018386; JLCPCB Part Number: C3018386; Power Rating: 1W; Category: Resistors; Package Size: 2512; JLCPCB Basic Part: Yes; Tolerance: ±5%; Voltage Rating: 200V; Temperature Rating: -55℃~+155℃; ComponentLink1Description: Datasheet; ComponentLink1URL: https://wmsc.lcsc.com/wmsc/upload/file/pdf/v2/lcsc/2205131745_VO-SCR2512J750K_C3018386.pdf; ComponentLink2Description: JLCPCB Part URL; ComponentLink2URL: https://jlcpcb.com/partdetail/C3018386
pins: 1, 2
1 alternate drawing of the same symbol
